# Altium footprint library ConnectMedical_BAC.PcbLib: 83 footprints (part 6 of 6)
Each footprint in its own frame and in the unit in brackets; x right, y up, seen from the top. Pads: shape width x height; smd on the part's side, far side on the other; paste and mask are expansions set on the pad; w line width, h text height; cw(c..) or ccw(c..) is an arc to the next point about the centre after c.
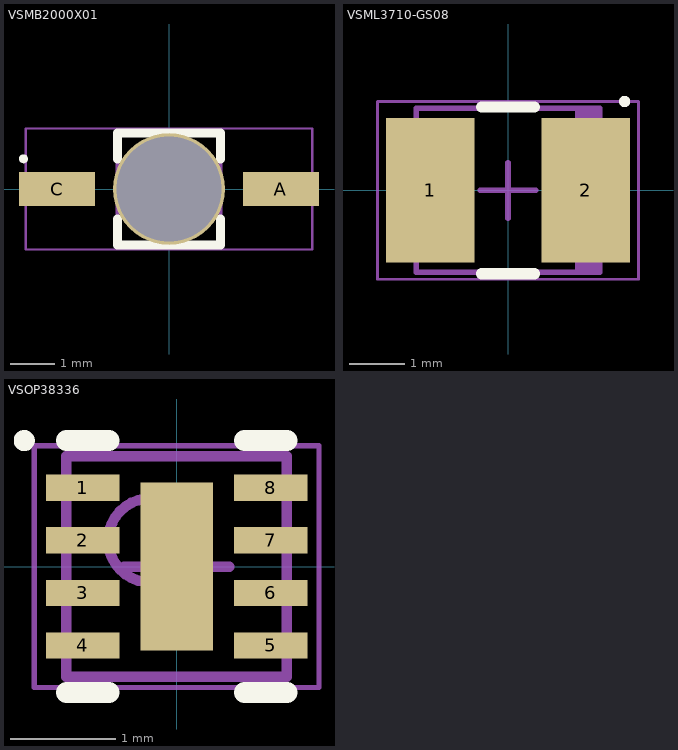
[diagram p5: the footprints below, top view; thin cyan lines are the x and y axes]

## VSMB2000X01 [mm] "High Speed Infrared Emitting Diodes, 2-Leads, Body 2.30x5.80mm, IPC High Density"
height 2.97
pads (3):
  rect 1.7x0.75 smd: A(2.5,0) C(-2.5,0)
  round 2.5 hole 2.35: ""(0,0)
Top Overlay:
  circle w0.1: c-3.25,0.675 r0.05
  lines w0.2: -1.15,-0.675 -1.15,-1.25 1.15,-1.25 1.15,-0.675 ; -1.15,0.675 -1.15,1.25 1.15,1.25 1.15,0.675
Mechanical 13:
  lines w0.1: -1.15,-1.25 -1.15,1.25 1.15,1.25 1.15,-1.25 -1.15,-1.25
Mechanical 15:
  lines w0.05: -3.2,-1.35 -3.2,1.35 3.2,1.35 3.2,-1.35 -3.2,-1.35
  lines w0.1: -0.5,0 0.5,0 ; 0,-0.5 0,0.5
3D body "VEMB2000x01.step": height 1.8, standoff -0.97, extent -2.9,-1.15 2.9,1.15

## VSML3710-GS08 [mm] "High Power Infrared Emitting Diode, 2-Leads, Body 3.50x2.80mm, IPC High Density"
height 1.85
pads (2):
  rect 1.6x2.6 smd: 1(-1.4,0) 2(1.4,0)
Top Overlay:
  circle w0.1: c2.1,1.6 r0.05
  lines w0.2: -0.475,-1.5 0.475,-1.5 ; -0.475,1.5 0.475,1.5
Mechanical 13:
  rectangle: 1.206,-1.475 1.65,1.475
  lines w0.1: -1.65,-1.475 1.65,-1.475 1.65,1.475 -1.65,1.475 -1.65,-1.475
Mechanical 15:
  lines w0.05: -2.35,-1.6 2.35,-1.6 2.35,1.6 -2.35,1.6 -2.35,-1.6
  lines w0.1: -0.5,0 0.5,0 ; 0,-0.5 0,0.5
3D body "VSML3710-GS08.step": height 1.85, standoff 0, extent -1.87,-1.475 1.87,1.475

## VSOP38336 [mm] "SON, 8-Leads, Body 2.00x2.00mm, Pitch 0.50mm, Thermal Pad 1.60x0.69mm, IPC High Density"
height 0.81
pads (9):
  rect 0.7x0.25 smd: 1(-0.895,0.75) 2(-0.895,0.25) 3(-0.895,-0.25) 4(-0.895,-0.75) 5(0.895,-0.75) 6(0.895,-0.25) 7(0.895,0.25) 8(0.895,0.75)
  rect 0.69x1.6 smd: ""(0,0)
Top Overlay:
  circle w0.1: c-1.45,1.2 r0.05
  lines w0.2: -1.05,-1.2 -0.645,-1.2 ; -1.05,1.2 -0.645,1.2 ; 0.645,-1.2 1.05,-1.2 ; 0.645,1.2 1.05,1.2
Mechanical 13:
  circle w0.1: c-0.25,0.25 r0.4
  lines w0.1: -1.05,-1.05 -1.05,1.05 1.05,1.05 1.05,-1.05 -1.05,-1.05
Mechanical 15:
  lines w0.05: -1.355,-1.15 -1.355,1.15 1.355,1.15 1.355,-1.15 -1.355,-1.15
  lines w0.1: -0.5,0 0.5,0 ; 0,-0.5 0,0.5
3D body "VSOP383.step": height 0.81, standoff 0, extent -1.051,-1.05 1.051,1.05